# Altium footprint library Dart_Controller_Pcblib.PcbLib: 132 footprints (part 8 of 9)
Each footprint in its own frame and in the unit in brackets; x right, y up, seen from the top. Pads: shape width x height; smd on the part's side, far side on the other; paste and mask are expansions set on the pad; w line width, h text height; cw(c..) or ccw(c..) is an arc to the next point about the centre after c.
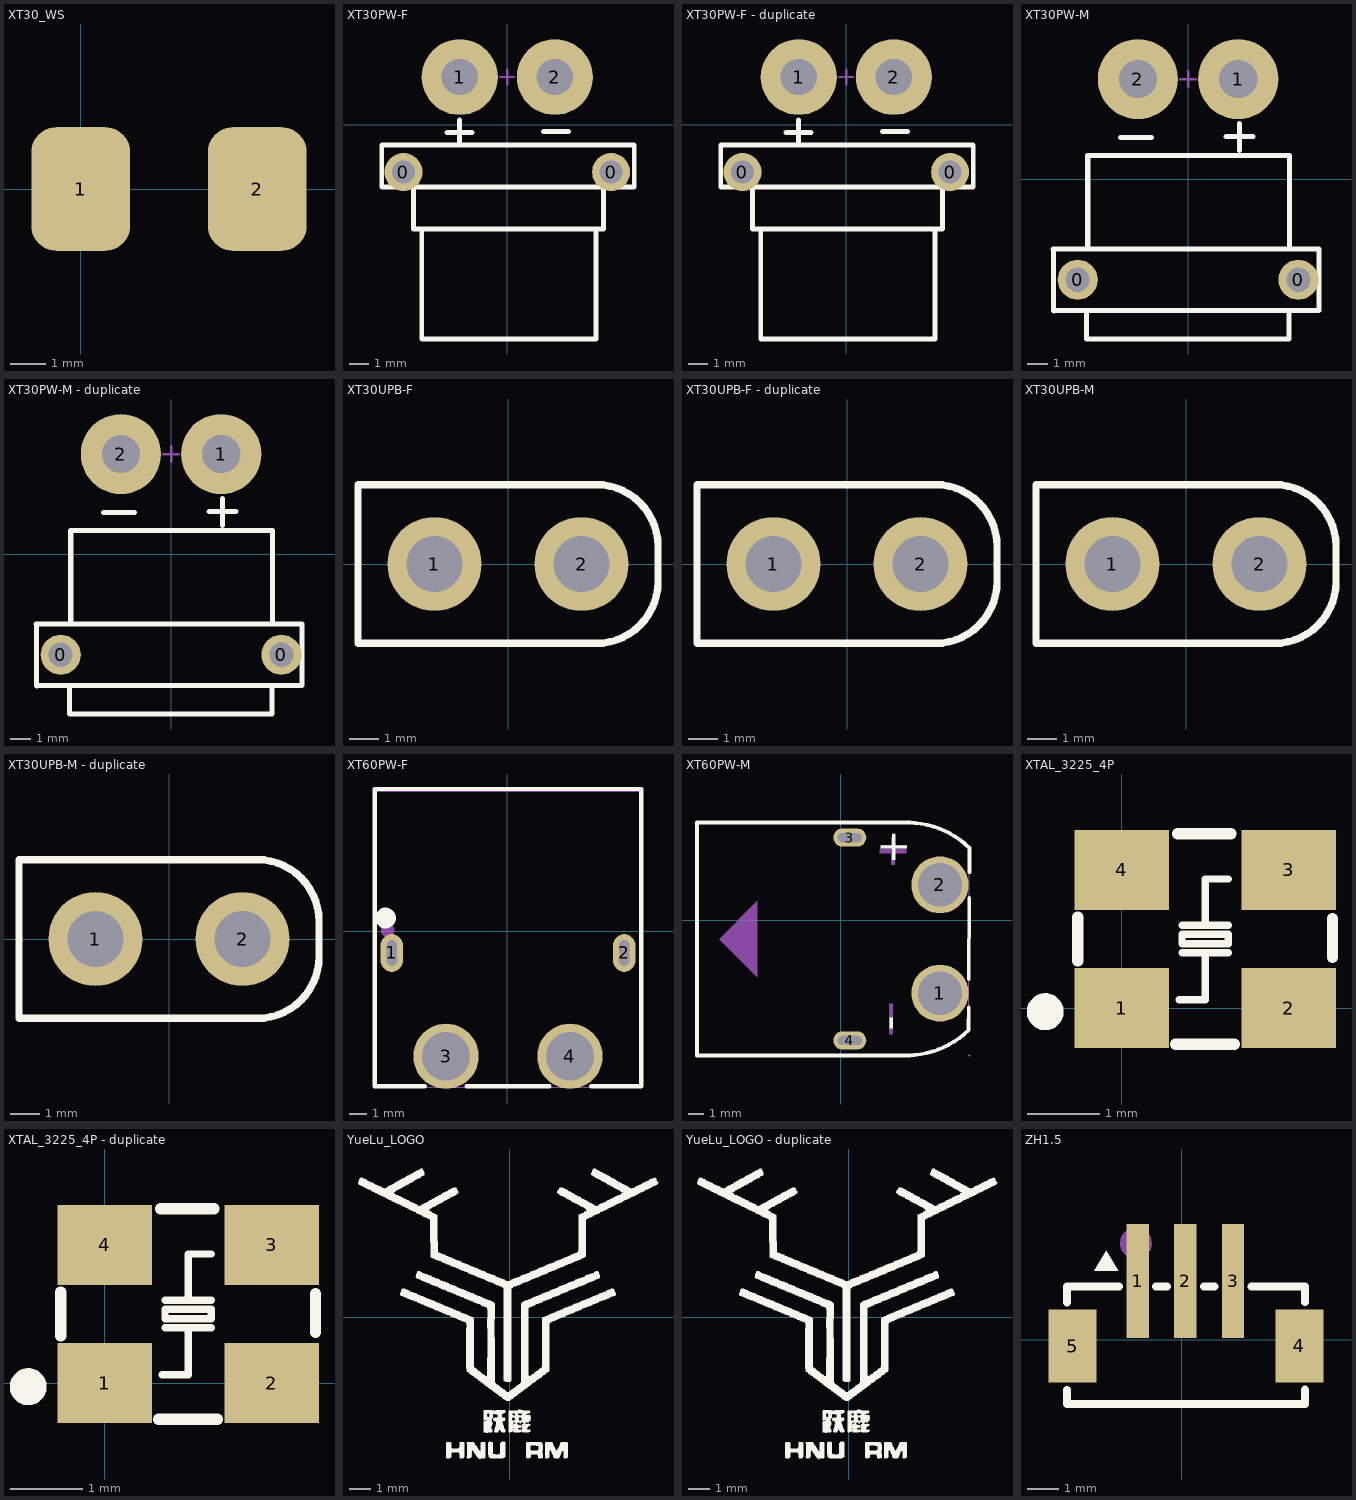
[diagram p7: the footprints below, top view; thin cyan lines are the x and y axes]

## XT30_WS [mm]
pads (2):
  rrect50% 2.8x3.5 smd mask+0: 1(0,0) 2(5,0)
3D body "User Library-XT30.step": height 2.6, standoff -2.7, extent -2.66,-14.505 7.74,0.995

## XT30PW-F [mm]
pads (4):
  round 2 hole 1.2: 0(-5.461,-2.5) 0(5.461,-2.5)
  round 4 hole 1.9: 1(-2.5,2.5) 2(2.5,2.5)
Top Overlay:
  lines w0.254: -6.604,-3.277 6.68,-3.277 6.68,-1.067 -6.604,-1.067 -6.604,-3.251 ; -4.928,-3.429 -4.928,-5.486 4.147,-5.486 5.055,-5.486 5.055,-3.454 ; -4.496,-5.512 -4.496,-11.278 4.674,-11.278 4.674,-5.486 ; -3.175,-0.417 -1.854,-0.417 ; -2.515,-1.027 -2.515,0.243 ; 1.905,-0.366 3.226,-0.366
Mechanical 15:
  lines w0.127: -0.381,2.5 0.381,2.5 ; 0,2.119 0,2.881
3D body "User Library-XT30PW-F.STEP": height 5, standoff -2, extent -6.624,-11.35 6.676,3.55

## XT30PW-F - duplicate [mm]
pads (4):
  round 2 hole 1.2: 0(-5.461,-2.5) 0(5.461,-2.5)
  round 4 hole 1.9: 1(-2.5,2.5) 2(2.5,2.5)
Top Overlay:
  lines w0.254: -6.604,-3.277 6.68,-3.277 6.68,-1.067 -6.604,-1.067 -6.604,-3.251 ; -4.928,-3.429 -4.928,-5.486 4.147,-5.486 5.055,-5.486 5.055,-3.454 ; -4.496,-5.512 -4.496,-11.278 4.674,-11.278 4.674,-5.486 ; -3.175,-0.417 -1.854,-0.417 ; -2.515,-1.027 -2.515,0.243 ; 1.905,-0.366 3.226,-0.366
Mechanical 15:
  lines w0.127: -0.381,2.5 0.381,2.5 ; 0,2.119 0,2.881
3D body "User Library-XT30PW-F.STEP": height 5, standoff -2, extent -6.624,-11.35 6.676,3.55

## XT30PW-M [mm]
pads (4):
  round 2 hole 1.2: 0(-5.5,-5) 0(5.5,-5)
  round 4 hole 1.9: 1(2.5,5) 2(-2.5,5)
Top Overlay:
  lines w0.254: -6.731,-3.458 6.502,-3.458 ; -6.706,-3.48 -6.706,-6.528 -6.68,-6.553 ; -6.676,-6.528 6.401,-6.528 ; -5.055,-6.528 -5.055,-7.954 5.029,-7.954 5.029,-6.528 ; -5,-3.429 -5,1.168 -5,1.194 5.055,1.194 5.055,-3.404 ; -3.353,2.083 -1.829,2.083 ; 1.905,2.134 3.226,2.134 ; 2.565,1.448 2.565,1.524 2.565,2.794 ; 6.528,-6.528 6.528,-3.458
Mechanical 15:
  lines w0.127: -0.381,5 0.381,5 ; 0,4.619 0,5.381
3D body "User Library-XT30PW-M.STEP": height 5, standoff -2, extent -6.645,-7.966 6.655,5.984

## XT30PW-M - duplicate [mm]
pads (4):
  round 2 hole 1.2: 0(-5.5,-5) 0(5.5,-5)
  round 4 hole 1.9: 1(2.5,5) 2(-2.5,5)
Top Overlay:
  lines w0.254: -6.731,-3.458 6.502,-3.458 ; -6.706,-3.48 -6.706,-6.528 -6.68,-6.553 ; -6.676,-6.528 6.401,-6.528 ; -5.055,-6.528 -5.055,-7.954 5.029,-7.954 5.029,-6.528 ; -5,-3.429 -5,1.168 -5,1.194 5.055,1.194 5.055,-3.404 ; -3.353,2.083 -1.829,2.083 ; 1.905,2.134 3.226,2.134 ; 2.565,1.448 2.565,1.524 2.565,2.794 ; 6.528,-6.528 6.528,-3.458
Mechanical 15:
  lines w0.127: -0.381,5 0.381,5 ; 0,4.619 0,5.381
3D body "User Library-XT30PW-M.STEP": height 5, standoff -2, extent -6.645,-7.966 6.655,5.984

## XT30UPB-F [mm]
pads (2):
  round 3.2 hole 1.9: 1(-2.5,0) 2(2.5,0)
Top Overlay:
  lines w0.254: -5.1,-2.7 3,-2.7 ccw(c3,-0.6) 5.1,-0.6 5.1,0.6 ccw(c3,0.6) 3,2.7 -5.1,2.7 -5.1,-2.7
3D body "User Library-XT30UPB-F-1.STEP": height 9.4, standoff -2, extent -5.1,-2.6 5.1,2.6

## XT30UPB-F - duplicate [mm]
pads (2):
  round 3.2 hole 1.9: 1(-2.5,0) 2(2.5,0)
Top Overlay:
  lines w0.254: -5.1,-2.7 3,-2.7 ccw(c3,-0.6) 5.1,-0.6 5.1,0.6 ccw(c3,0.6) 3,2.7 -5.1,2.7 -5.1,-2.7
3D body "User Library-XT30UPB-F-1.STEP": height 9.4, standoff -2, extent -5.1,-2.6 5.1,2.6

## XT30UPB-M [mm]
pads (2):
  round 3.2 hole 1.9: 1(-2.5,0) 2(2.5,0)
Top Overlay:
  lines w0.254: -5.1,-2.7 -5.1,2.7 3,2.7 cw(c3,0.6) 5.1,0.6 5.1,-0.6 cw(c3,-0.6) 3,-2.7 -5.1,-2.7
3D body "User Library-XT30.step": height 12.6, standoff -2.9, extent -5.2,-2.7 5.2,2.6

## XT30UPB-M - duplicate [mm]
pads (2):
  round 3.2 hole 1.9: 1(-2.5,0) 2(2.5,0)
Top Overlay:
  lines w0.254: -5.1,-2.7 3,-2.7 ccw(c3,-0.6) 5.1,-0.6 5.1,0.6 ccw(c3,0.6) 3,2.7 -5.1,2.7 -5.1,-2.7
3D body "User Library-XT30.step": height 12.6, standoff -2.9, extent -5.2,-2.7 5.2,2.6

## XT60PW-F [mm]
pads (4):
  oval 1.3x2.2 hole 0.6 slot 1.5 at 90 deg paste-2539.97 mask+0.05: 1(-6.697,-1.251) 2(6.803,-1.251)
  round 3.8 hole 2.8 paste-2539.97 mask+0.05: 3(-3.547,-7.251) 4(3.652,-7.251)
Top Overlay:
  circle w0.6: c-7.059,0.781 r0.3
  lines w0.254: -4.773,-8.998 -7.694,-8.998 -7.694,8.274 7.8,8.274 7.8,-8.998 4.879,-8.998 ; -2.36,-8.998 2.466,-8.998
Mechanical 6:
  circle w0.4: c-6.932,0.067 r0.2
Mechanical 15:
  region: -7.637,-9.051 -7.637,-9.026 -7.673,-8.991 -7.722,-8.991 -7.757,-9.026 -7.757,-9.051 -7.757,-9.076 -7.722,-9.111 -7.673,-9.111 -7.638,-9.076
  region: 4.903,-7.251 4.903,-7.087 4.817,-6.769 4.653,-6.483 4.42,-6.251 4.135,-6.086 3.817,-6.001 3.488,-6.001 3.17,-6.086 2.885,-6.251 2.652,-6.484 2.487,-6.769 2.402,-7.087 2.402,-7.251 2.402,-7.416 2.488,-7.734 2.652,-8.019 2.885,-8.252 3.17,-8.416 3.488,-8.501 3.817,-8.501 4.135,-8.416 4.42,-8.251 4.653,-8.019 4.817,-7.734 4.903,-7.416
  region: -2.297,-7.251 -2.297,-7.087 -2.382,-6.769 -2.547,-6.483 -2.78,-6.251 -3.065,-6.086 -3.383,-6.001 -3.712,-6.001 -4.03,-6.086 -4.315,-6.251 -4.548,-6.484 -4.712,-6.769 -4.798,-7.087 -4.798,-7.251 -4.798,-7.416 -4.712,-7.734 -4.548,-8.019 -4.315,-8.252 -4.03,-8.416 -3.712,-8.501 -3.383,-8.501 -3.065,-8.416 -2.78,-8.251 -2.547,-8.019 -2.382,-7.734 -2.297,-7.416
  region: 6.978,-0.701 6.978,-1.801 6.628,-1.801 6.628,-0.701
  region: -6.522,-0.701 -6.522,-1.801 -6.872,-1.801 -6.872,-0.701
  lines w0.051: -7.697,-9.051 7.803,-9.051 7.803,8.149 -7.697,8.149 -7.697,-9.051
3D body "未命名-PCBModelCOMPOUND003.step": height 8.6, standoff -3.8, extent -7.659,-8.894 7.841,8.306

## XT60PW-M [mm]
pads (4):
  round 3.8 hole 2.9 paste-2539.97 mask+0.05: 1(6.606,-4.863) 2(6.606,2.337)
  oval 2.2x1.2 hole 0.6 slot 1.6 at 0 deg paste-2539.97 mask+0.05: 3(0.606,5.487) 4(0.606,-8.013)
Top Overlay:
  lines w0.254: 4.495,-9.01 ccw(c4.352,-3.012) 8.523,-7.325 ; 4.543,6.484 cw(c4.4,0.486) 8.571,4.799 8.562,3.178 ; 4.606,-9.013 -9.56,-9.013 -9.56,6.487 4.606,6.487 ; 8.507,-7.256 8.515,-5.806 ; 8.525,-3.939 8.553,1.476
  text "-" at 4.162,-7.359 h2.03
  text "+" at 4.416,3.69 h2.03
Mechanical 6:
  region: -5.538,1.277 -5.538,-3.803 -8.078,-1.263
  region: 3.352,5.468 3.606,5.468 3.606,4.706 4.368,4.706 4.368,4.452 3.606,4.452 3.606,3.69 3.352,3.69 3.352,4.452 2.59,4.452 2.59,4.706 3.352,4.706
  region: 3.225,-5.581 3.479,-5.581 3.479,-7.613 3.225,-7.613
Mechanical 15:
  region: 8.619,-9.01 8.618,-8.986 8.583,-8.952 8.535,-8.952 8.5,-8.986 8.499,-9.01 8.5,-9.034 8.535,-9.067 8.583,-9.067 8.618,-9.034
  region: 7.606,2.337 7.606,2.469 7.538,2.723 7.406,2.951 7.22,3.138 6.992,3.269 6.737,3.337 6.474,3.337 6.22,3.269 5.992,3.138 5.805,2.951 5.674,2.723 5.606,2.469 5.606,2.337 5.606,2.206 5.674,1.951 5.805,1.723 5.992,1.537 6.22,1.405 6.474,1.337 6.737,1.337 6.992,1.405 7.22,1.537 7.406,1.723 7.538,1.951 7.606,2.206
  region: 7.606,-4.863 7.606,-4.731 7.538,-4.477 7.406,-4.249 7.22,-4.062 6.992,-3.931 6.737,-3.862 6.474,-3.862 6.22,-3.931 5.992,-4.062 5.805,-4.249 5.674,-4.477 5.606,-4.731 5.606,-4.863 5.606,-4.994 5.674,-5.249 5.805,-5.477 5.992,-5.663 6.22,-5.795 6.474,-5.863 6.737,-5.863 6.992,-5.795 7.22,-5.663 7.406,-5.477 7.538,-5.249 7.606,-4.994
  region: 1.206,5.687 1.206,5.287 0.006,5.287 0.006,5.687
  region: 1.206,-7.813 1.206,-8.213 0.006,-8.213 0.006,-7.813
  lines w0.051: -9.56,-9.01 4.749,-9.01 5.765,-8.756 6.781,-8.502 7.543,-8.121 8.305,-7.486 8.507,-7.256 8.559,4.706 8.432,4.833 7.416,5.595 6.4,6.103 5.384,6.357 4.622,6.484 -9.56,6.484 -9.56,-9.01
3D body "未命名-PCBModelCONN-TH_XT60PW-M.step": height 8.1, standoff -3, extent -9.442,-9.325 8.658,6.175

## XTAL_3225_4P [mm]
pads (4):
  rect 1.3x1.1 smd: 1(0,0) 2(2.3,0) 3(2.3,1.9) 4(0,1.9)
Top Overlay:
  circle w0.254: c-1.05,-0.05 r0.127
  lines w0.1: 0.833,0.759 1.468,0.76 ; 0.833,1.14 1.468,1.141 ; 1.15,0.112 1.15,0.76 ; 1.15,1.141 1.15,1.775 1.468,1.775 ; 0.833,0.887 0.833,1.014 1.468,1.013 1.468,0.887 0.833,0.887
  lines w0.102: 0.794,0.112 1.15,0.112
  lines w0.152: -0.603,0.645 -0.603,1.255 ; 0.744,-0.498 1.556,-0.498 ; 0.769,2.398 1.506,2.398 ; 2.903,0.696 2.903,1.229
3D body "XTAL-3225.STEP": height 0.8, standoff 0, extent -0.45,-0.295 2.75,2.205

## XTAL_3225_4P - duplicate [mm]
pads (4):
  rect 1.3x1.1 smd: 1(0,0) 2(2.3,0) 3(2.3,1.9) 4(0,1.9)
Top Overlay:
  circle w0.254: c-1.05,-0.05 r0.127
  lines w0.1: 0.833,0.759 1.468,0.76 ; 0.833,1.14 1.468,1.141 ; 1.15,0.112 1.15,0.76 ; 1.15,1.141 1.15,1.775 1.468,1.775 ; 0.833,0.887 0.833,1.014 1.468,1.013 1.468,0.887 0.833,0.887
  lines w0.102: 0.794,0.112 1.15,0.112
  lines w0.152: -0.603,0.645 -0.603,1.255 ; 0.744,-0.498 1.556,-0.498 ; 0.769,2.398 1.506,2.398 ; 2.903,0.696 2.903,1.229
3D body "XTAL-3225.STEP": height 0.8, standoff 0, extent -0.45,-0.295 2.75,2.205

## YueLu_LOGO [mm]
Top Overlay:
  drawing of 11 lines, arcs and shapes, not listed

## YueLu_LOGO - duplicate [mm]
Top Overlay:
  drawing of 11 lines, arcs and shapes, not listed

## ZH1.5 [mm]
pads (5):
  rect 0.7x3.6 smd paste+0 mask+0.05: 1(-1.391,1.843) 2(0.109,1.843) 3(1.609,1.843)
  rect 1.5x2.3 smd paste+0 mask+0.05: 4(3.701,-0.198) 5(-3.441,-0.207)
Top Overlay:
  region: -2.376,2.799 -2.757,2.164 -1.995,2.164
  lines w0.254: -3.62,-1.588 -3.62,-2.032 3.88,-2.032 3.88,-1.579 ; -3.62,1.218 -3.62,1.174 -3.62,1.668 -1.972,1.668 ; -0.81,1.668 -0.472,1.668 ; 0.69,1.668 1.028,1.668 ; 2.19,1.668 3.88,1.668 3.88,1.183
Mechanical 15:
  circle w0.5: c-1.446,3.034 r0.25
3D body "ZH1.5_CORR.step": height 5.1, standoff 0, extent -3.623,-2.241 3.877,2.96